# Altium footprint library THU VIEN V1.PcbLib: 400 footprints (part 4 of 25)
Each footprint in its own frame and in the unit in brackets; x right, y up, seen from the top. Pads: shape width x height; smd on the part's side, far side on the other; paste and mask are expansions set on the pad; w line width, h text height; cw(c..) or ccw(c..) is an arc to the next point about the centre after c.
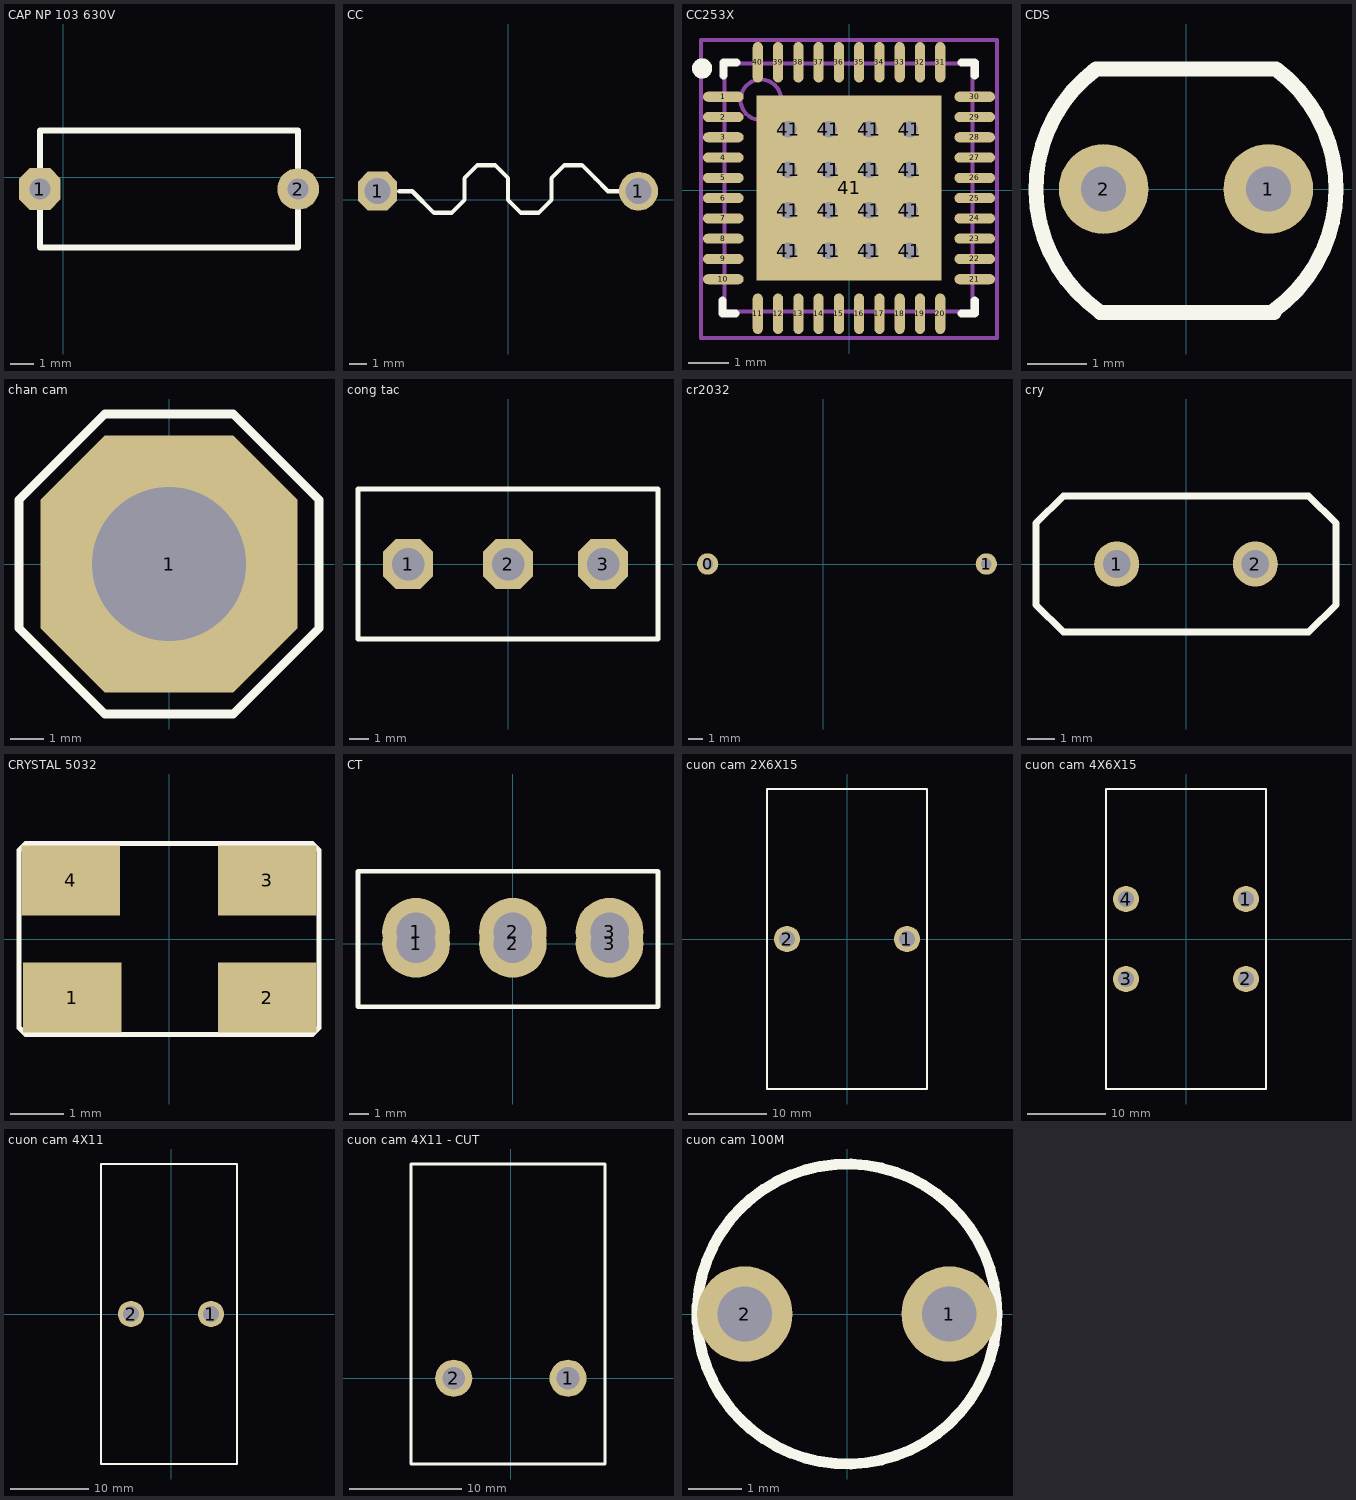
[diagram p3: the footprints below, top view; thin cyan lines are the x and y axes]

## CAP NP 103 630V [mil]
pads (2):
  oct 70x70 hole 35: 1(-39.37,-19.68)
  round 70 hole 35: 2(393.7,-19.68)
Top Overlay:
  lines w10: -39.37,-118.11 -39.37,78.74 393.7,78.74 393.7,-118.11 -39.37,-118.11

## CC [mil]
pads (2):
  oct 90x90 hole 60: 1(-300,20)
  round 90 hole 60: 1(300,20)
Top Overlay:
  lines w10: -250,20 -220,20 -170,-30 -130,-30 -100,0 -100,50 -70,80 -30,80 0,50 0,0 30,-30 70,-30 100,0 100,50 130,80 170,80 200,50 230,20 260,20

## CC253X [mm]
pads (57):
  oval 1x0.25 smd: 1(-3.1,2.3) 2(-3.1,1.8) 3(-3.1,1.3) 4(-3.1,0.8) 5(-3.1,0.3) 6(-3.1,-0.2) 7(-3.1,-0.7) 8(-3.1,-1.2) 9(-3.1,-1.7) 10(-3.1,-2.2) 21(3.1,-2.2) 22(3.1,-1.7) 23(3.1,-1.2) 24(3.1,-0.7) 25(3.1,-0.2) 26(3.1,0.3) 27(3.1,0.8) 28(3.1,1.3) 29(3.1,1.8) 30(3.1,2.3)
  oval 0.25x1 smd: 11(-2.25,-3.05) 12(-1.75,-3.05) 13(-1.25,-3.05) 14(-0.75,-3.05) 15(-0.25,-3.05) 16(0.25,-3.05) 17(0.75,-3.05) 18(1.25,-3.05) 19(1.75,-3.05) 20(2.25,-3.05) 31(2.25,3.15) 32(1.75,3.15) 33(1.25,3.15) 34(0.75,3.15) 35(0.25,3.15) 36(-0.25,3.15) 37(-0.75,3.15) 38(-1.25,3.15) 39(-1.75,3.15) 40(-2.25,3.15)
  round 0.8 hole 0.4: 41(-1.5,-1.5) 41(-1.5,-0.5) 41(-1.5,0.5) 41(-1.5,1.5) 41(-0.5,-1.5) 41(-0.5,-0.5) 41(-0.5,0.5) 41(-0.5,1.5) 41(0.5,-1.5) 41(0.5,-0.5) 41(0.5,0.5) 41(0.5,1.5) 41(1.5,-1.5) 41(1.5,-0.5) 41(1.5,0.5) 41(1.5,1.5)
  rect 4.572x4.572 smd: 41(0,0.05)
Top Overlay:
  circle w0.25: c-3.625,3 r0.125
  lines w0.2: -3.125,-2.725 -3.125,-3.05 -2.8,-3.05 ; -3.1,2.825 -3.1,3.15 -2.775,3.15 ; 2.775,-3.05 3.1,-3.05 3.1,-2.725 ; 2.775,3.15 3.1,3.15 3.1,2.825
Mechanical 13:
  circle w0.1: c-2.175,2.225 r0.5
  lines w0.1: -3.075,-3 -3.075,3.125 3.05,3.125 3.05,-3 -3.075,-3
Mechanical 15:
  lines w0.1: 0,-0.45 1,-0.45 ; 0.5,-0.95 0.5,0.05 ; -3.65,-3.65 -3.65,3.7 3.65,3.7 3.65,-3.65 -3.65,-3.65
3D body: height 1.04, standoff -0.01, extent -3.075,-3.025 3.075,3.125

## CDS [mil]
pads (2):
  round 60 hole 30: 1(55.12,0) 2(-55.12,0)
Top Overlay:
  lines w10: -57.56,-82.79 59.06,-82.79 ; -57.56,-82.23 cw(c0,0) -60.22,80.3 60.22,80.3 cw(c0,0) 58.29,-81.71
3D body: height 160, standoff -1330, extent -91,-75.26 91,78.74

## chan cam [mil]
pads (1):
  oct 300x300 hole 180: 1(0,0)
Top Overlay:
  lines w10: -175,-75 -175,75 -75,175 75,175 175,75 175,-75 75,-175 -75,-175 -175,-75

## CHAN CAM 2 [mm]

## cong tac [mil]
pads (3):
  oct 100x100 hole 65: 1(-200,0) 2(0,0) 3(190,0)
Top Overlay:
  lines w10: -300,-150 300,-150 300,150 -300,150 -300,-150

## cr2032 [mil]
pads (2):
  round 60 hole 30: 0(-325,0) 1(460,0)
3D body: height 307.94, standoff -111.35, extent -432.93,-444.07 492.27,445.69

## cry [mil]
pads (2):
  round 65 hole 40: 1(-100,0) 2(100,0)
Top Overlay:
  lines w10: -216.54,-59.06 -216.54,59.06 -177.17,98.43 177.17,98.43 216.54,59.06 216.54,-59.06 177.17,-98.43 -177.17,-98.43 -216.54,-59.06
3D body: height 145.67, standoff -149.61, extent -223.43,-93.07 223.43,90

## CRYSTAL 5032 [mm]
pads (4):
  rect 1.83x1.3 smd: 1(-1.803,-1.092) 2(1.829,-1.092) 3(1.829,1.092) 4(-1.829,1.092)
Top Overlay:
  lines w0.1: -2.794,-1.651 -2.794,1.651 -2.667,1.778 2.667,1.778 2.794,1.651 2.794,1.524 2.794,-1.651 2.667,-1.778 -2.667,-1.778 -2.794,-1.651
3D body: height 0.9, standoff -0.05, extent -2.5,-1.6 2.5,1.6

## CT [mil]
pads (6):
  round 140 hole 80: 1(-200,0) 1(-200,25) 2(0,0) 2(0,25) 3(200,0) 3(200,25)
Top Overlay:
  lines w10: -320,-130 -320,150 300,150 300,-130 -320,-130

## cuon cam 2X6X15 [mil]
pads (2):
  round 130 hole 80: 1(300,0) 2(-300,0)
Top Overlay:
  lines w10: -400,-750 -400,750 400,750 400,-750 -400,-750

## cuon cam 4X6X15 [mil]
pads (4):
  round 130 hole 80: 1(300,200) 2(300,-200) 3(-300,-200) 4(-300,200)
Top Overlay:
  lines w10: -400,-750 400,-750 400,750 -400,750 -400,-750

## cuon cam 4X11 [mil]
pads (2):
  round 130 hole 80: 1(200,0) 2(-200,0)
Top Overlay:
  lines w10: -350,-750 -350,750 330,750 330,-750 -350,-750
3D body: height 715.1, standoff -1917.24, extent -349.06,-1332.26 330.05,1108.16

## cuon cam 4X11 - CUT [mil]
pads (2):
  round 130 hole 80: 1(200,0) 2(-200,0)
Top Overlay:
  lines w10: -350,-300 -350,750 330,750 330,-300 -350,-300
3D body: height 715.1, standoff -1917.24, extent -349.06,-1332.26 330.05,1108.16

## cuon cam 100M [mil]
pads (2):
  round 70 hole 40: 1(75,0) 2(-75,0)
Top Overlay:
  circle w8: c0,0 r110
3D body: height 50, standoff -50, extent 55.16,-19.96 95,19.96
3D body: height 50, standoff -50, extent -94.84,-19.96 -55,19.96
3D body: height 305, standoff 5, extent -109.13,-109.78 110,109.79